# Altium footprint library ref-packages-longpad.PCBLIB: 1527 footprints (part 40 of 103) (continued)
## PGA503 [mil] (continued)
Top Overlay:
  lines w6: -15.32,-53.43 74.69,-53.43 74.69,-8.43 84.69,-8.43 cw(c84.69,-18.43) 94.69,-18.43 94.69,-53.43 129.69,-53.43 139.69,-33.43 179.69,-33.43 189.69,-53.43 209.69,-53.43 169.69,51.57 149.69,51.57 119.69,-18.43 ; 119.68,-23.43 ccw(c102.19,-19.67) 109.69,-3.43 ccw(c92.19,21.34) 94.69,51.57 9.69,51.57 ; -75.32,31.57 -75.32,51.57 ; -75.32,31.57 -75.32,-33.43 -40.32,-33.43 -40.32,31.57 -75.32,31.57 ; -75.32,51.57 -95.32,51.57 -95.32,-33.43 -130.32,51.57 -150.32,51.57 -190.32,-53.43 -170.32,-53.43 -160.32,-33.43 -120.32,-33.43 -110.32,-53.43 -20.32,-53.43 -20.32,31.57 9.69,31.57 ; -75.32,51.57 9.69,51.57 ; 9.69,31.57 9.69,51.57 ; 9.69,31.57 9.69,11.57 49.69,11.57 49.69,31.57 9.69,31.57 ; -155.32,-13.43 -140.32,31.57 -125.32,-13.43 -155.32,-13.43 ; 9.69,-28.43 49.69,-28.43 49.69,-8.43 9.69,-8.43 9.69,-28.43 ; 74.69,11.57 74.69,31.57 89.69,31.57 cw(c89.69,21.57) 89.69,11.57 74.69,11.57 ; 144.69,-13.43 174.69,-13.43 159.69,31.57 144.69,-13.43
  lines w8: -1090.55,-1074.8 -1090.55,1074.8 cw(c-1074.8,1074.81) -1074.8,1090.56 1074.8,1090.55 cw(c1074.81,1074.8) 1090.56,1074.8 1090.55,-1074.8 cw(c1074.81,-1074.8) 1074.8,-1090.55 -1074.8,-1090.55 cw(c-1074.8,-1074.81) -1090.55,-1074.8 ; -547.24,-527.56 -547.24,527.56 cw(c-527.54,527.56) -527.56,547.26 527.56,547.24 cw(c527.56,527.54) 547.26,527.56 547.24,-527.56 cw(c527.56,-527.56) 527.56,-547.24 -527.56,-547.24 cw(c-527.56,-527.56) -547.24,-527.56
  lines w10: -1075,1025 -1025,1025 -1025,1075 -1075,1075 -1075,1025
Mechanical 16:
  lines w8: -799.21,-759.84 -799.21,759.84 cw(c-759.84,759.84) -759.84,799.21 759.84,799.21 cw(c759.84,759.84) 799.21,759.84 799.21,-759.84 cw(c759.84,-759.84) 759.84,-799.21 -759.84,-799.21 cw(c-759.84,-759.84) -799.21,-759.84 ; -748.03,-700.79 -748.03,700.79 -700.79,748.03 700.79,748.03 748.03,700.79 748.03,-700.79 700.79,-748.03 -700.79,-748.03 -748.03,-700.79
  text "PGA503" at -135.63,-403.74 h77.5

## PGA599 [mil]
pads (599):
  round 40 hole 24: A3(-1050,1150) A5(-950,1150) A7(-850,1150) A9(-750,1150) A11(-650,1150) A13(-550,1150) A15(-450,1150) A17(-350,1150) A19(-250,1150) A21(-150,1150) A23(-50,1150) A25(50,1150) A27(150,1150) A29(250,1150) A31(350,1150) A33(450,1150) A35(550,1150) A37(650,1150) A39(750,1150) A41(850,1150) A43(950,1150) A45(1050,1150) A47(1150,1150) AA1(-1150,150) AA3(-1050,150) AA5(-950,150) AA7(-850,150) AA41(850,150) AA43(950,150) AA45(1050,150) AA47(1150,150) AB2(-1100,100) AB4(-1000,100) AB6(-900,100) AB8(-800,100) AB40(800,100) AB42(900,100) AB44(1000,100) AB46(1100,100) AC1(-1150,50) AC3(-1050,50) AC5(-950,50) AC7(-850,50) AC41(850,50) AC43(950,50) AC45(1050,50) AC47(1150,50) AD2(-1100,0) AD4(-1000,0) AD6(-900,0) AD8(-800,0) AD40(800,0) AD42(900,0) AD44(1000,0) AD46(1100,0) AE1(-1150,-50) AE3(-1050,-50) AE5(-950,-50) AE7(-850,-50) AE41(850,-50) AE43(950,-50) AE45(1050,-50) AE47(1150,-50) AF2(-1100,-100) AF4(-1000,-100) AF6(-900,-100) AF8(-800,-100) AF40(800,-100) AF42(900,-100) AF44(1000,-100) AF46(1100,-100) AG1(-1150,-150) AG3(-1050,-150) AG5(-950,-150) AG7(-850,-150) AG41(850,-150) AG43(950,-150) AG45(1050,-150) AG47(1150,-150) AH2(-1100,-200) AH4(-1000,-200) AH6(-900,-200) AH8(-800,-200) AH40(800,-200) AH42(900,-200) AH44(1000,-200) AH46(1100,-200) AJ1(-1150,-250) AJ3(-1050,-250) AJ5(-950,-250) AJ7(-850,-250) AJ41(850,-250) AJ43(950,-250) AJ45(1050,-250) AJ47(1150,-250) AK2(-1100,-300) AK4(-1000,-300) AK6(-900,-300) AK8(-800,-300) AK40(800,-300) AK42(900,-300) AK44(1000,-300) AK46(1100,-300) AL1(-1150,-350) AL3(-1050,-350) AL5(-950,-350) AL7(-850,-350) AL41(850,-350) AL43(950,-350) AL45(1050,-350) AL47(1150,-350) AM2(-1100,-400) AM4(-1000,-400) AM6(-900,-400) AM8(-800,-400) AM40(800,-400) AM42(900,-400) AM44(1000,-400) AM46(1100,-400) AN1(-1150,-450) AN3(-1050,-450) AN5(-950,-450) AN7(-850,-450) AN41(850,-450) AN43(950,-450) AN45(1050,-450) AN47(1150,-450) AP2(-1100,-500) AP4(-1000,-500) AP6(-900,-500) AP8(-800,-500) AP40(800,-500) AP42(900,-500) AP44(1000,-500) AP46(1100,-500) AR1(-1150,-550) AR3(-1050,-550) AR5(-950,-550) AR7(-850,-550) AR41(850,-550) AR43(950,-550) AR45(1050,-550) AR47(1150,-550) AT2(-1100,-600) AT4(-1000,-600) AT6(-900,-600) AT8(-800,-600) AT40(800,-600) AT42(900,-600) AT44(1000,-600) AT46(1100,-600) AU1(-1150,-650) AU3(-1050,-650) AU5(-950,-650) AU7(-850,-650) AU41(850,-650) AU43(950,-650) AU45(1050,-650) AU47(1150,-650) AV2(-1100,-700) AV4(-1000,-700) AV6(-900,-700) AV8(-800,-700) AV40(800,-700) AV42(900,-700) AV44(1000,-700) AV46(1100,-700) AW1(-1150,-750) AW3(-1050,-750) AW5(-950,-750) AW7(-850,-750) AW9(-750,-750) AW39(750,-750) AW41(850,-750) AW43(950,-750) AW45(1050,-750) AW47(1150,-750) AY2(-1100,-800) AY4(-1000,-800) AY6(-900,-800) AY8(-800,-800) AY10(-700,-800) AY38(700,-800) AY40(800,-800) AY42(900,-800) AY44(1000,-800) AY46(1100,-800) B2(-1100,1100) B4(-1000,1100) B6(-900,1100) B8(-800,1100) B10(-700,1100) B12(-600,1100) B14(-500,1100) B16(-400,1100) B18(-300,1100) B20(-200,1100) B22(-100,1100) B24(0,1100) B26(100,1100) B28(200,1100) B30(300,1100) B32(400,1100) B34(500,1100) B36(600,1100) B38(700,1100) B40(800,1100) B42(900,1100) B44(1000,1100) B46(1100,1100) BA1(-1150,-850) BA3(-1050,-850) BA5(-950,-850) BA7(-850,-850) BA9(-750,-850) BA11(-650,-850) BA13(-550,-850) BA15(-450,-850) BA17(-350,-850) BA19(-250,-850) BA21(-150,-850) BA23(-50,-850) BA25(50,-850) BA27(150,-850) BA29(250,-850) BA31(350,-850) BA33(450,-850) BA35(550,-850) BA37(650,-850) BA39(750,-850) BA41(850,-850) BA43(950,-850) BA45(1050,-850) BA47(1150,-850) BB2(-1100,-900) BB4(-1000,-900) BB6(-900,-900) BB8(-800,-900) BB10(-700,-900) BB12(-600,-900) BB14(-500,-900) BB16(-400,-900) BB18(-300,-900) BB20(-200,-900) BB22(-100,-900) BB24(0,-900) BB26(100,-900) BB28(200,-900) BB30(300,-900) BB32(400,-900) BB34(500,-900) BB36(600,-900) BB38(700,-900) BB40(800,-900) BB42(900,-900) BB44(1000,-900) BB46(1100,-900) BC1(-1150,-950) BC3(-1050,-950) BC5(-950,-950) BC7(-850,-950) BC9(-750,-950) BC11(-650,-950) BC13(-550,-950) BC15(-450,-950) BC17(-350,-950) BC19(-250,-950) BC21(-150,-950) BC23(-50,-950) BC25(50,-950) BC27(150,-950) BC29(250,-950) BC31(350,-950) BC33(450,-950) BC35(550,-950) BC37(650,-950) BC39(750,-950) BC41(850,-950) BC43(950,-950) BC45(1050,-950) BC47(1150,-950) BD2(-1100,-1000) BD4(-1000,-1000) BD6(-900,-1000) BD8(-800,-1000) BD10(-700,-1000) BD12(-600,-1000) BD14(-500,-1000) BD16(-400,-1000) BD18(-300,-1000) BD20(-200,-1000) BD22(-100,-1000) BD24(0,-1000) BD26(100,-1000) BD28(200,-1000) BD30(300,-1000) BD32(400,-1000) BD34(500,-1000) BD36(600,-1000) BD38(700,-1000) BD40(800,-1000) BD42(900,-1000) BD44(1000,-1000) BD46(1100,-1000) BE1(-1150,-1050) BE3(-1050,-1050) BE5(-950,-1050) BE7(-850,-1050) BE9(-750,-1050) BE11(-650,-1050) BE13(-550,-1050) BE15(-450,-1050) BE17(-350,-1050) BE19(-250,-1050) BE21(-150,-1050) BE23(-50,-1050) BE25(50,-1050) BE27(150,-1050) BE29(250,-1050) BE31(350,-1050) BE33(450,-1050) BE35(550,-1050) BE37(650,-1050) BE39(750,-1050) BE41(850,-1050) BE43(950,-1050) BE45(1050,-1050) BE47(1150,-1050) BF2(-1100,-1100) BF4(-1000,-1100) BF6(-900,-1100) BF8(-800,-1100) BF10(-700,-1100) BF12(-600,-1100) BF14(-500,-1100) BF16(-400,-1100) BF18(-300,-1100) BF20(-200,-1100) BF22(-100,-1100) BF24(0,-1100) BF26(100,-1100) BF28(200,-1100) BF30(300,-1100) BF32(400,-1100) BF34(500,-1100) BF36(600,-1100) BF38(700,-1100) BF40(800,-1100) BF42(900,-1100) BF44(1000,-1100) BF46(1100,-1100) BG1(-1150,-1150) BG3(-1050,-1150) BG5(-950,-1150) BG7(-850,-1150) BG9(-750,-1150) BG11(-650,-1150) BG13(-550,-1150) BG15(-450,-1150) BG17(-350,-1150) BG19(-250,-1150) BG21(-150,-1150) BG23(-50,-1150) BG25(50,-1150) BG27(150,-1150) BG29(250,-1150) BG31(350,-1150) BG33(450,-1150) BG35(550,-1150) BG37(650,-1150) BG39(750,-1150) BG41(850,-1150) BG43(950,-1150) BG45(1050,-1150) BG47(1150,-1150) C1(-1150,1050) C3(-1050,1050) C5(-950,1050) C7(-850,1050) C9(-750,1050) C11(-650,1050) C13(-550,1050) C15(-450,1050) C17(-350,1050) C19(-250,1050) C21(-150,1050) C23(-50,1050) C25(50,1050) C27(150,1050) C29(250,1050) C31(350,1050) C33(450,1050) C35(550,1050) C37(650,1050) C39(750,1050) C41(850,1050) C43(950,1050) C45(1050,1050) C47(1150,1050) D2(-1100,1000) D4(-1000,1000) D6(-900,1000) D8(-800,1000) D10(-700,1000) D12(-600,1000) D14(-500,1000) D16(-400,1000) D18(-300,1000) D20(-200,1000) D22(-100,1000) D24(0,1000) D26(100,1000) D28(200,1000) D30(300,1000) D32(400,1000) D34(500,1000) D36(600,1000) D38(700,1000) D40(800,1000) D42(900,1000) D44(1000,1000) D46(1100,1000) E1(-1150,950) E3(-1050,950) E5(-950,950) E7(-850,950) E9(-750,950) E11(-650,950) E13(-550,950) E15(-450,950) E17(-350,950) E19(-250,950) E21(-150,950) E23(-50,950) E25(50,950) E27(150,950) E29(250,950) E31(350,950) E33(450,950) E35(550,950) E37(650,950) E39(750,950) E41(850,950) E43(950,950) E45(1050,950) E47(1150,950) F2(-1100,900) F4(-1000,900) F6(-900,900) F8(-800,900) F10(-700,900) F12(-600,900) F14(-500,900) F16(-400,900) F18(-300,900) F20(-200,900) F22(-100,900) F24(0,900) F26(100,900) F28(200,900) F30(300,900) F32(400,900) F34(500,900) F36(600,900) F38(700,900) F40(800,900) F42(900,900) F44(1000,900) F46(1100,900) G1(-1150,850) G3(-1050,850) G5(-950,850) G7(-850,850) G9(-750,850) G11(-650,850) G13(-550,850) G15(-450,850) G17(-350,850) G19(-250,850) G21(-150,850) G23(-50,850) G25(50,850) G27(150,850) G29(250,850) G31(350,850) G33(450,850) G35(550,850) G37(650,850) G39(750,850) G41(850,850) G43(950,850) G45(1050,850) G47(1150,850) H2(-1100,800) H4(-1000,800) H6(-900,800) H8(-800,800) H38(700,800) H40(800,800) H42(900,800) H44(1000,800) H46(1100,800) J1(-1150,750) J3(-1050,750) J5(-950,750) J7(-850,750) J39(750,750) J41(850,750) J43(950,750) J45(1050,750) J47(1150,750) K2(-1100,700) K4(-1000,700) K6(-900,700) K8(-800,700) K40(800,700) K42(900,700) K44(1000,700) K46(1100,700) L1(-1150,650) L3(-1050,650) L5(-950,650) L7(-850,650) L41(850,650) L43(950,650) L45(1050,650) L47(1150,650) M2(-1100,600) M4(-1000,600) M6(-900,600) M8(-800,600) M40(800,600) M42(900,600) M44(1000,600) M46(1100,600) N1(-1150,550) N3(-1050,550) N5(-950,550) N7(-850,550) N41(850,550) N43(950,550) N45(1050,550) N47(1150,550) P2(-1100,500) P4(-1000,500) P6(-900,500) P8(-800,500) P40(800,500) P42(900,500) P44(1000,500) P46(1100,500) R1(-1150,450) R3(-1050,450) R5(-950,450) R7(-850,450) R41(850,450) R43(950,450) R45(1050,450) R47(1150,450) T2(-1100,400) T4(-1000,400) T6(-900,400) T8(-800,400) T40(800,400) T42(900,400) T44(1000,400) T46(1100,400) U1(-1150,350) U3(-1050,350) U5(-950,350) U7(-850,350) U41(850,350) U43(950,350) U45(1050,350) U47(1150,350) V2(-1100,300) V4(-1000,300) V6(-900,300) V8(-800,300) V40(800,300) V42(900,300) V44(1000,300) V46(1100,300) W1(-1150,250) W3(-1050,250) W5(-950,250) W7(-850,250) W41(850,250) W43(950,250) W45(1050,250) W47(1150,250) Y2(-1100,200) Y4(-1000,200) Y6(-900,200) Y8(-800,200) Y40(800,200) Y42(900,200) Y44(1000,200) Y46(1100,200)
Top Overlay:
  lines w6: -15.32,-53.43 74.69,-53.43 74.69,-8.43 84.69,-8.43 cw(c84.69,-18.43) 94.69,-18.43 94.69,-53.43 129.69,-53.43 139.69,-33.43 179.69,-33.43 189.69,-53.43 209.69,-53.43 169.69,51.57 149.69,51.57 119.69,-18.43 ; 119.68,-23.43 ccw(c102.19,-19.67) 109.69,-3.43 ccw(c92.19,21.34) 94.69,51.57 9.69,51.57 ; -75.32,31.57 -75.32,51.57 ; -75.32,31.57 -75.32,-33.43 -40.32,-33.43 -40.32,31.57 -75.32,31.57 ; -75.32,51.57 -95.32,51.57 -95.32,-33.43 -130.32,51.57 -150.32,51.57 -190.32,-53.43 -170.32,-53.43 -160.32,-33.43 -120.32,-33.43 -110.32,-53.43 -20.32,-53.43 -20.32,31.57 9.69,31.57 ; -75.32,51.57 9.69,51.57 ; 9.69,31.57 9.69,51.57 ; 9.69,31.57 9.69,11.57 49.69,11.57 49.69,31.57 9.69,31.57 ; -155.32,-13.43 -140.32,31.57 -125.32,-13.43 -155.32,-13.43 ; 9.69,-28.43 49.69,-28.43 49.69,-8.43 9.69,-8.43 9.69,-28.43 ; 74.69,11.57 74.69,31.57 89.69,31.57 cw(c89.69,21.57) 89.69,11.57 74.69,11.57 ; 144.69,-13.43 174.69,-13.43 159.69,31.57 144.69,-13.43
  lines w8: -1232.28,-1192.91 -1232.28,1192.91 cw(c-1192.91,1192.91) -1192.91,1232.28 1192.91,1232.28 cw(c1192.91,1192.91) 1232.28,1192.91 1232.28,-1192.91 cw(c1192.91,-1192.91) 1192.91,-1232.28 -1192.91,-1232.28 cw(c-1192.91,-1192.91) -1232.28,-1192.91 ; -1204.72,1129.92 -1129.92,1129.92 -1129.92,1204.72 -1204.72,1204.72 -1204.72,1129.92
Mechanical 16:
  lines w8: -799.21,-779.53 -799.21,779.53 cw(c-779.53,779.53) -779.54,799.21 779.53,799.21 cw(c779.53,779.53) 799.21,779.54 799.21,-779.53 cw(c779.53,-779.53) 779.53,-799.21 -779.53,-799.21 cw(c-779.53,-779.53) -799.21,-779.53 ; -748.03,-708.66 -748.03,708.66 -708.66,748.03 708.66,748.03 748.03,708.66 748.03,-708.66 708.66,-748.03 -708.66,-748.03 -748.03,-708.66
  text "PGA599" at -135.63,-353.74 h77.5

## PGA-108 [mil]
pads (108):
  round 48 hole 32: A1(-550,550)
  oct 48x48 hole 32: A2(-450,550) A3(-350,550) A4(-250,550) A5(-150,550) A6(-50,550) A7(50,550) A8(150,550) A9(250,550) A10(350,550) A11(450,550) A12(550,550) B1(-550,450) B2(-450,450) B3(-350,450) B4(-250,450) B5(-150,450) B6(-50,450) B7(50,450) B8(150,450) B9(250,450) B10(350,450) B11(450,450) B12(550,450) C1(-550,350) C2(-450,350) C3(-350,350) C4(-250,350) C5(-150,350) C6(-50,350) C7(50,350) C8(150,350) C9(250,350) C10(350,350) C11(450,350) C12(550,350) D1(-550,250) D2(-450,250) D3(-350,250) D10(350,250) D11(450,250) D12(550,250) E1(-550,150) E2(-450,150) E3(-350,150) E10(350,150) E11(450,150) E12(550,150) F1(-550,50) F2(-450,50) F3(-350,50) F10(350,50) F11(450,50) F12(550,50) G1(-550,-50) G2(-450,-50) G3(-350,-50) G10(350,-50) G11(450,-50) G12(550,-50) H1(-550,-150) H2(-450,-150) H3(-350,-150) H10(350,-150) H11(450,-150) H12(550,-150) J1(-550,-250) J2(-450,-250) J3(-350,-250) J10(350,-250) J11(450,-250) J12(550,-250) K1(-550,-350) K2(-450,-350) K3(-350,-350) K4(-250,-350) K5(-150,-350) K6(-50,-350) K7(50,-350) K8(150,-350) K9(250,-350) K10(350,-350) K11(450,-350) K12(550,-350) L1(-550,-450) L2(-450,-450) L3(-350,-450) L4(-250,-450) L5(-150,-450) L6(-50,-450) L7(50,-450) L8(150,-450) L9(250,-450) L10(350,-450) L11(450,-450) L12(550,-450) M1(-550,-550) M2(-450,-550) M3(-350,-550) M4(-250,-550) M5(-150,-550) M6(-50,-550) M7(50,-550) M8(150,-550) M9(250,-550) M10(350,-550) M11(450,-550) M12(550,-550)
Top Overlay:
  lines w6: -625,-625 625,-625 625,625 -575,625 -625,575 -625,-625 ; -300,-300 300,-300 300,300 -150,300 -300,150 -300,-300

## PLCC4-TOPLED-RG [mm]
pads (5):
  round 2.8 hole 2.8: 1(0,0)
  rect 4x4 smd: 1(2.25,-3.55) 2(2.2,3.55) 3(-2.25,3.55) 4(-2.25,-3.55)
Top Overlay:
  rectangle: -0.5,0.1 -0.1,0.5
  rectangle: 0.1,-0.5 0.5,-0.1
  rectangle: -0.5,-0.5 -0.1,-0.1
Top Paste:
  rectangle: -1.25,1.55 -0.25,2.95
  rectangle: 0.2,1.55 1.2,2.95
  rectangle: 0.25,-2.95 1.25,-1.55
  rectangle: -1.25,-2.95 -0.25,-1.55
Mechanical 16:
  lines w0.102: -1,-1.6 -1,-2.65 -0.5,-2.65 -0.5,-1.65 ; -1,1.6 -1,2.65 -0.5,2.65 -0.5,1.65 ; 0.5,-1.65 0.5,-2.65 1,-2.65 1,-1.6 ; 0.5,1.65 0.5,2.65 1.1,2.65 1.1,1.6
  lines w0.203: 0.85,-1.6 -1,-1.6 -1.4,-1.6 -1.4,1.6 -1,1.6 1.1,1.6 1.4,1.6 1.4,-1.05 ; 0.85,-1.6 1,-1.6 1.4,-1.6 1.4,-1.05 ; 0.85,-1.6 1.4,-1.05

## PLCC20 [mil]
pads (20):
  rect 70.87x29.92 smd: 1(-159.45,0) 2(-159.45,-50) 3(-159.45,-100) 9(159.45,-100) 10(159.45,-50) 11(159.45,0) 12(159.45,50) 13(159.45,100) 19(-159.45,100) 20(-159.45,50)
  rect 29.92x70.87 smd: 4(-100,-159.45) 5(-50,-159.45) 6(0,-159.45) 7(50,-159.45) 8(100,-159.45) 14(100,159.45) 15(50,159.45) 16(0,159.45) 17(-50,159.45) 18(-100,159.45)
Top Overlay:
  lines w2: -185.04,185.04 -145.67,165.35 ; -184.65,-126.38 -145.67,-165.35 ; -145.67,-184.65 -145.67,-165.35 ; -145.67,-117.76 -145.67,-165.35 ; -145.67,-82.24 -145.67,-67.76 ; -145.67,-32.24 -145.67,-17.76 ; -145.67,17.76 -145.67,32.24 ; -145.67,67.76 -145.67,82.24 ; -145.67,117.76 -145.67,165.35 ; -117.76,-165.35 -145.67,-165.35 ; -117.76,165.35 -145.67,165.35 ; -82.24,-165.35 -67.76,-165.35 ; -82.24,165.35 -67.76,165.35 ; -32.24,-165.35 -17.76,-165.35 ; -32.24,165.35 -17.76,165.35 ; 17.76,-165.35 32.24,-165.35 ; 17.76,165.35 32.24,165.35 ; 67.76,-165.35 82.24,-165.35 ; 67.76,165.35 82.24,165.35 ; 117.76,-165.35 157.48,-165.35 ; 117.76,165.35 157.48,165.35 ; 165.35,-117.76 165.35,-157.48 ; 165.35,-82.24 165.35,-67.76 ; 165.35,-32.24 165.35,-17.76 ; 165.35,17.76 165.35,32.24 ; 165.35,67.76 165.35,82.24 ; 165.35,117.76 165.35,157.48 ; 169.29,-185.04 157.48,-165.35 ; 169.29,185.04 157.48,165.35 ; 185.04,-169.29 165.35,-157.48 ; 185.04,169.29 165.35,157.48 ; 157.48,-165.35 165.35,-157.48 ; 157.48,165.35 165.35,157.48
  lines w6: -185.04,-119.33 -185.04,-126.38 -145.67,-185.04 -119.33,-185.04 ; -185.04,-80.67 -185.04,-69.33 ; -185.04,-30.67 -185.04,-19.33 ; -185.04,19.33 -185.04,30.67 ; -185.04,69.33 -185.04,80.67 ; -185.04,119.33 -185.04,185.04 -119.33,185.04 ; -80.67,-185.04 -69.33,-185.04 ; -80.67,185.04 -69.33,185.04 ; -30.67,-185.04 -19.33,-185.04 ; -30.67,185.04 -19.33,185.04 ; 19.33,-185.04 30.67,-185.04 ; 19.33,185.04 30.67,185.04 ; 69.33,-185.04 80.67,-185.04 ; 69.33,185.04 80.67,185.04 ; 119.33,-185.04 169.29,-185.04 185.04,-169.29 185.04,-119.33 ; 119.33,185.04 169.29,185.04 185.04,169.29 185.04,119.33 ; 185.04,-80.67 185.04,-69.33 ; 185.04,-30.67 185.04,-19.33 ; 185.04,19.33 185.04,30.67 ; 185.04,69.33 185.04,80.67
Mechanical 16:
  rectangle: -109.84,-194.88 -90.16,-185.04
  rectangle: -109.84,185.04 -90.16,194.88
  rectangle: -59.84,185.04 -40.16,194.88
  rectangle: -9.84,185.04 9.84,194.88
  rectangle: 40.16,185.04 59.84,194.88
  rectangle: 90.16,185.04 109.84,194.88
  rectangle: 40.16,185.04 59.84,194.88
  rectangle: -9.84,185.04 9.84,194.88
  rectangle: 185.04,90.16 194.88,109.84
  rectangle: 185.04,40.16 194.88,59.84
  rectangle: 185.04,-9.84 194.88,9.84
  rectangle: 185.04,-59.84 194.88,-40.16
  rectangle: 185.04,-109.84 194.88,-90.16
  rectangle: -59.84,-194.88 -40.16,-185.04
  rectangle: -9.84,-194.88 9.84,-185.04
  rectangle: 40.16,-194.88 59.84,-185.04
  rectangle: 90.16,-194.88 109.84,-185.04
  rectangle: -194.88,90.16 -185.04,109.84
  rectangle: -194.88,40.16 -185.04,59.84
  rectangle: -194.88,-9.84 -185.04,9.84
  rectangle: -194.88,-59.84 -185.04,-40.16
  rectangle: -194.88,-109.84 -185.04,-90.16
  lines w2: -185.04,-125.98 -145.67,-165.35 ; -185.04,185.04 -145.67,165.35 ; 169.29,-185.04 157.48,-165.35 ; 169.29,185.04 157.48,165.35 ; 185.04,-169.29 165.35,-157.48 ; 185.04,169.29 165.35,157.48 ; -145.67,-165.35 157.48,-165.35 ; -145.67,-165.35 -145.67,165.35 ; -145.67,165.35 157.48,165.35 ; 157.48,-165.35 165.35,-157.48 ; 157.48,165.35 165.35,157.48 ; 165.35,-157.48 165.35,157.48 ; -175.2,-9.84 ccw(c-165.35,-9.84) -155.51,-9.84 -155.51,9.84 ccw(c-165.35,9.84) -175.2,9.84 -175.2,-9.84
  lines w6: -185.04,-125.98 -185.04,185.04 169.29,185.04 185.04,169.29 185.04,-169.29 169.29,-185.04 -145.67,-185.04 -185.04,-125.98

## PLCC20S [mil]
pads (20):
  rect 23.62x86.61 smd: 1(0,169.29) 2(-50,169.29) 3(-100,169.29) 9(-100,-169.29) 10(-50,-169.29) 11(0,-169.29) 12(50,-169.29) 13(100,-169.29) 19(100,169.29) 20(50,169.29)
  rect 86.61x23.62 smd: 4(-169.29,100) 5(-169.29,50) 6(-169.29,0) 7(-169.29,-50) 8(-169.29,-100) 14(169.29,-100) 15(169.29,-50) 16(169.29,0) 17(169.29,50) 18(169.29,100)
Mechanical 16:
  circle w24: c0,149.61 r11.81
  rectangle: -10.24,194.88 10.24,212.6
  rectangle: -60.24,194.88 -39.76,212.6
  rectangle: -110.24,194.88 -89.76,212.6
  rectangle: -212.6,89.76 -194.88,110.24
  rectangle: -212.6,39.76 -194.88,60.24
  rectangle: -212.6,-10.24 -194.88,10.24
  rectangle: -212.6,-60.24 -194.88,-39.76
  rectangle: -212.6,-110.24 -194.88,-89.76
  rectangle: -110.24,-212.6 -89.76,-194.88
  rectangle: -60.24,-212.6 -39.76,-194.88
  rectangle: -10.24,-212.6 10.24,-194.88
  rectangle: 39.76,-212.6 60.24,-194.88
  rectangle: 89.76,-212.6 110.24,-194.88
  rectangle: 194.88,-110.24 212.6,-89.76
  rectangle: 194.88,-60.24 212.6,-39.76
  rectangle: 194.88,-10.24 212.6,10.24
  rectangle: 194.88,39.76 212.6,60.24
  rectangle: 194.88,89.76 212.6,110.24
  rectangle: 89.76,194.88 110.24,212.6
  rectangle: 39.76,194.88 60.24,212.6
  lines w8: -192.91,-192.91 -192.91,104.92 -104.92,192.91 192.91,192.91 192.91,-192.91 -192.91,-192.91
Mechanical 27:
  lines w7.87: -232.4,-232.4 232.4,-232.4 232.4,232.4 -232.4,232.4 -232.4,-232.4